# Altium footprint library Apalis Evaluation Board.PcbLib: 166 footprints (part 7 of 11)
Each footprint in its own frame and in the unit in brackets; x right, y up, seen from the top. Pads: shape width x height; smd on the part's side, far side on the other; paste and mask are expansions set on the pad; w line width, h text height; cw(c..) or ccw(c..) is an arc to the next point about the centre after c.
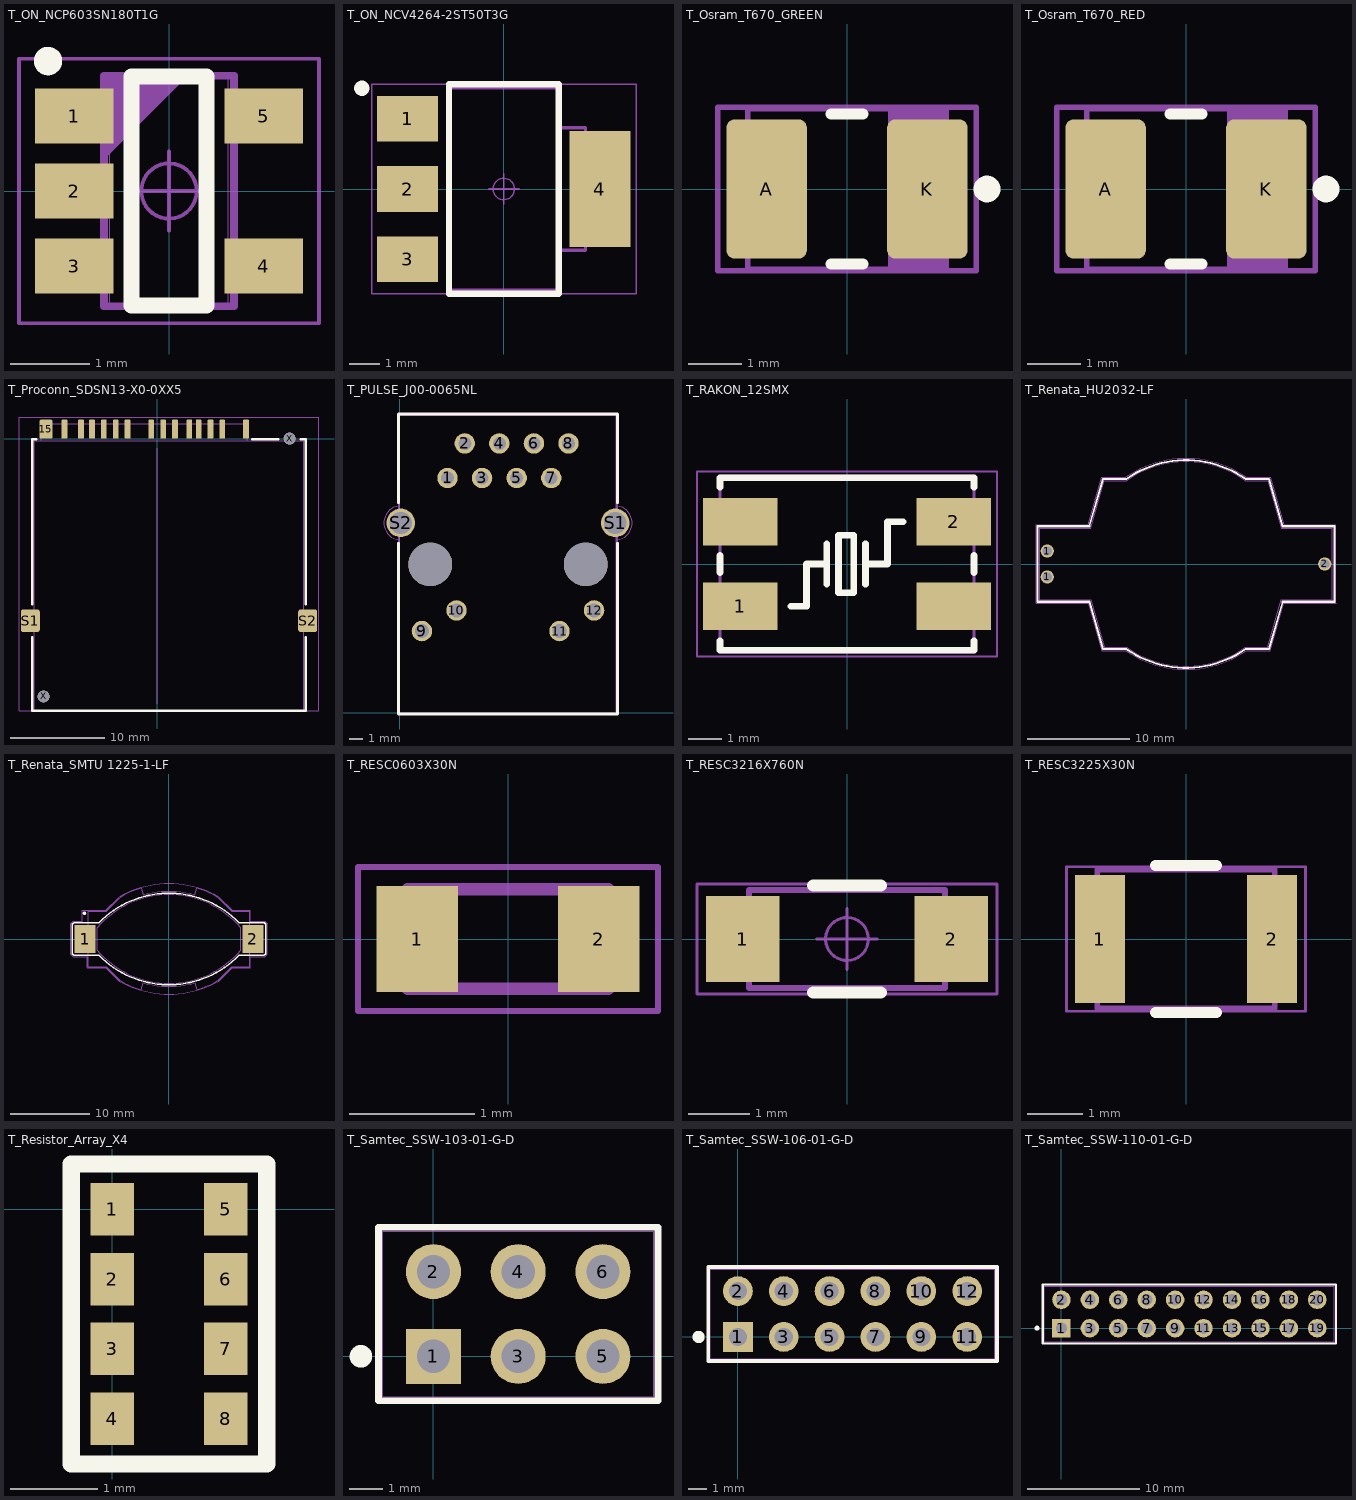
[diagram p6: the footprints below, top view; thin cyan lines are the x and y axes]

## T_ON_NCP603SN180T1G [mm] "SOT 23"
height 1.1
pads (5):
  rect 1x0.7 smd: 1(-1.2,0.95) 2(-1.2,0) 3(-1.2,-0.95) 4(1.2,-0.95) 5(1.2,0.95)
Top Overlay:
  circle w0.2: c-1.533,1.646 r0.08
  lines w0.2: -0.475,-1.45 0.475,-1.45 0.475,1.45 -0.475,1.45 -0.475,-1.45
Mechanical 1:
  circle w0.05: c0,0 r0.35
  lines w0.05: -0.5,0 0.5,0 ; 0,-0.5 0,0.5 ; -1.9,-1.675 1.9,-1.675 1.9,1.675 -1.9,1.675 -1.9,-1.675
Mechanical 2:
  lines w0.001: -0.75,-1.5 0.75,-1.5 0.75,1.5 -0.75,1.5 -0.75,-1.5
Mechanical 3:
  lines w0.1: -0.825,0.46 0.175,1.46 ; -0.825,0.56 0.075,1.46 ; -0.825,0.66 -0.025,1.46 ; -0.825,0.76 -0.125,1.46 ; -0.825,0.86 -0.225,1.46 ; -0.825,0.96 -0.325,1.46 ; -0.825,1.06 -0.425,1.46 ; -0.825,1.16 -0.525,1.46 ; -0.825,1.26 -0.625,1.46 ; -0.825,1.36 -0.725,1.46 ; -0.825,-1.46 0.825,-1.46 0.825,1.46 -0.825,1.46 -0.825,-1.46
3D body: height 1.1, standoff 0, extent -0.75,-1.5 0.75,1.5

## T_ON_NCV4264-2ST50T3G [mm] "SO4"
height 1.8
pads (4):
  rect 2x1.5 smd: 1(-3.15,2.3) 2(-3.15,0) 3(-3.15,-2.3)
  rect 2x3.8 smd: 4(3.15,0)
Top Overlay:
  circle w0.25: c-4.65,3.3 r0.125
  lines w0.2: -1.8,-3.43 -1.8,3.43 1.8,3.43 1.8,-3.43 -1.8,-3.43
Mechanical 1:
  circle w0.05: c0,0 r0.35
  lines w0.05: -0.5,0 0.5,0 ; 0,-0.5 0,0.5 ; -4.33,-3.43 -4.33,3.43 4.33,3.43 4.33,-3.43 -4.33,-3.43
Mechanical 2:
  lines w0.001: -1.85,-3.35 1.85,-3.35 1.85,3.35 -1.85,3.35 -1.85,-3.35
Mechanical 3:
  lines w0.1: 1.79,-2.006 2.68,-2.006 2.68,2.006 1.79,2.006 ; -1.79,-3.302 -1.79,3.302 1.79,3.302 1.79,-3.302 -1.79,-3.302
3D body: height 1.75, standoff 0, extent -1.85,-3.35 1.85,3.35

## T_Osram_T670_GREEN [mm] "LED-Osram-T670"
height 2.1
pads (2):
  rrect20% 1.5x2.6 smd: A(-1.5,0) K(1.5,0)
Top Overlay:
  circle w0.25: c2.613,0 r0.125
  lines w0.2: -0.3,-1.4 0.3,-1.4 ; -0.3,1.4 0.3,1.4
Mechanical 1:
  lines w0.1: -2.413,-1.524 2.413,-1.524 2.413,1.524 -2.413,1.524 -2.413,-1.524
Mechanical 2:
  lines w0.001: -1.85,-1.5 1.85,-1.5 1.85,1.5 -1.85,1.5 -1.85,-1.5
Mechanical 3:
  rectangle: 0.762,-1.5 1.85,1.5
  lines w0.1: -1.85,-1.5 -1.85,1.5 1.85,1.5 1.85,-1.5 -1.85,-1.5
3D body: height 2.1, standoff 0, extent -1.85,-1.5 1.85,1.5

## T_Osram_T670_RED [mm] "LED-Osram-T670"
height 2.1
pads (2):
  rrect20% 1.5x2.6 smd: A(-1.5,0) K(1.5,0)
Top Overlay:
  circle w0.25: c2.613,0 r0.125
  lines w0.2: -0.3,-1.4 0.3,-1.4 ; -0.3,1.4 0.3,1.4
Mechanical 1:
  lines w0.1: -2.413,-1.524 2.413,-1.524 2.413,1.524 -2.413,1.524 -2.413,-1.524
Mechanical 2:
  lines w0.001: -1.85,-1.5 -1.85,1.5 1.85,1.5 1.85,-1.5 -1.85,-1.5
Mechanical 3:
  rectangle: 0.762,-1.5 1.85,1.5
  lines w0.1: -1.85,-1.5 1.85,-1.5 1.85,1.5 -1.85,1.5 -1.85,-1.5
3D body: height 2.1, standoff 0, extent -1.85,-1.5 1.85,1.5

## T_Proconn_SDSN13-X0-0XX5 [mm] "PROCONN_SD,SDIO/MMC,MMC4.0 CARDHOLDER"
height 3.25
pads (19):
  rrect25% 0.6x2 smd: 1(9.38,1) 2(6.88,1) 3(5.63,1) 4(4.38,1) 5(3.4,1) 6(1.88,1) 7(0.63,1) 8(-0.63,1) 9(-3.13,1) 10(-4.38,1) 11(-5.63,1) 12(-6.88,1) 13(-8.05,1) 14(-9.8,1)
  rrect25% 1.4x2 smd: 15(-11.75,1)
  rrect25% 2x2.4 smd: S1(-13.4,-19.25) S2(15.9,-19.25)
  round 1.25 hole 1.25 unplated: X(-12,-27.25) X(14,0)
Top Overlay:
  lines w0.254: -13.2,-21 -13.2,-28.75 15.7,-28.75 15.7,-21 ; -13.2,-17.5 -13.2,-0.05 -12.75,-0.05 ; 10.05,-0.05 12.8,-0.05 ; 15.15,-0.05 15.7,-0.05 15.7,-17.5
Mechanical 1:
  lines w0.05: -14.6,-28.75 17.1,-28.75 17.1,2.25 -14.6,2.25 -14.6,-28.75
Mechanical 2:
  lines w0.01: -13,-20.05 -13.95,-20.05 -13.95,-18.45 -13,-18.45 ; -12.27,-0.25 -12.27,1.55 9.5,1.55 9.5,-0.25 ; 0,-28 0,-1 ; 15.5,-20.05 16.45,-20.05 16.45,-18.45 15.5,-18.45 ; -13,-28.75 15.5,-28.75 15.5,-0.25 -13,-0.25 -13,-28.75
  text "CL CARD" at 2.77,-19 h2
Mechanical 3:
  lines w0.1: -13,-28.75 -13,-0.25 15.5,-0.25 15.5,-28.75 -13,-28.75
3D body: height 0.3, standoff 0, extent -13.95,-20.05 -13,-18.45
3D body: height 0.3, standoff 0, extent 15.5,-20.05 16.45,-18.45
3D body: height 3.25, standoff 0, extent -13,-28.75 15.5,-0.25

## T_PULSE_J00-0065NL [mm] "RJ45 Connector"
height 14.22
pads (16):
  round 1.5 hole 0.95: 1(3.495,17.24) 2(4.765,19.78) 3(6.035,17.24) 4(7.305,19.78) 5(8.575,17.24) 6(9.845,19.78) 7(11.115,17.24) 8(12.385,19.78)
  round 1.5 hole 1.02: 9(1.615,5.99) 10(4.155,7.51) 11(11.725,5.99) 12(14.265,7.51)
  round 2.1 hole 1.63: S1(15.815,13.94) S2(0.065,13.94)
  round 3.2 hole 3.2: ""(2.225,10.89) ""(13.655,10.89)
Top Overlay:
  lines w0.2: -0.102,12.446 -0.102,-0.102 15.983,-0.102 15.983,12.446 ; -0.102,15.418 -0.102,21.942 15.983,21.942 15.983,15.418
Mechanical 1:
  region: 5.81,17.065 5.81,17.415 6.26,17.415 6.26,17.065
  lines w0.05: -0.102,-0.102 -0.102,12.701 cw(c0.064,13.94) -0.101,15.179 -0.102,21.941 15.981,21.941 15.981,15.179 cw(c15.816,13.94) 15.981,12.701 15.981,-0.102 -0.102,-0.102
Mechanical 2:
  lines w0.001: 0,0 15.88,0 15.88,21.84 0,21.84 0,0
Mechanical 3:
  lines w0.1: -0.102,-0.102 15.983,-0.102 15.983,21.941 -0.102,21.941 -0.102,-0.102
3D body: height 13.32, standoff -3.23, extent 0,0 15.88,21.84

## T_RAKON_12SMX [mm] "OSC"
height 1.4
pads (4):
  rect 2.2x1.4 smd: 1(-3.15,-1.25) 2(3.15,1.25) ""(-3.15,1.25) ""(3.15,-1.25)
Top Overlay:
  lines w0.2: -3.75,-2.55 3.75,-2.55 ; -3.75,-2.548 -3.75,-2.269 ; -3.75,-0.25 -3.75,0.25 ; -3.75,2.269 -3.75,2.548 ; -3.75,2.55 3.75,2.55 ; -1.65,-1.25 -1.2,-1.25 ; -0.6,-0.6 -0.6,0.6 ; -0.6,0 -1.2,0 -1.2,-1.25 ; 0.55,-0.6 0.55,0.6 ; 0.55,0 1.2,0 1.2,1.25 1.65,1.25 ; 3.75,-2.548 3.75,-2.269 ; 3.75,-0.25 3.75,0.25 ; 3.75,2.269 3.75,2.548 ; -1.2,-1.25 -1.2,-1.25 ; -0.25,-0.85 0.2,-0.85 0.2,0.85 -0.25,0.85 -0.25,-0.85
Mechanical 1:
  lines w0.05: -4.43,-2.73 -4.43,2.73 4.43,2.73 4.43,-2.73 -4.43,-2.73
Mechanical 2:
  lines w0.001: -3.75,-2.6 -3.75,2.6 3.75,2.6 3.75,-2.6 -3.75,-2.6
Mechanical 3:
  lines w0.1: -3.75,-2.6 -3.75,2.6 3.75,2.6 3.75,-2.6 -3.75,-2.6
3D body: height 1.4, standoff 0, extent -3.75,-2.6 3.75,2.6

## T_Renata_HU2032-LF [mm] "C2032 Battery Holder"
height 5.2
pads (3):
  round 1.3 hole 0.9: 1(-13.6,-1.27) 1(-13.6,1.27) 2(13.6,0)
Top Overlay:
  lines w0.2: -5.86,8.331 -8.133,8.331 -9.483,3.7 -14.55,3.7 -14.55,-3.7 ; -5.845,-8.331 -8.135,-8.331 -9.48,-3.7 -14.55,-3.7 ; -5.843,-8.33 ccw(c0,0) 5.839,-8.334 ; -5.839,8.334 cw(c0,0) 5.843,8.33 ; 5.845,8.331 8.135,8.331 9.48,3.7 14.55,3.7 ; 5.86,-8.331 8.133,-8.331 9.483,-3.7 14.55,-3.7 14.55,3.7 ; -14.55,-3.7 -14.55,-3.7 ; 14.55,3.7 14.55,3.7
Mechanical 1:
  lines w0.05: -14.702,-3.851 -14.702,3.849 -9.599,3.849 ; -14.7,-3.85 -9.599,-3.85 -8.252,-8.489 -5.895,-8.489 ccw(c0,0) 5.895,-8.489 8.252,-8.489 ; -9.599,3.849 -8.252,8.489 ; -8.252,8.489 -5.895,8.489 cw(c0,0) 5.895,8.489 8.252,8.489 9.599,3.85 14.7,3.85 14.7,-3.85 ; 8.252,-8.489 9.599,-3.849 ; 9.599,-3.849 14.702,-3.849
Mechanical 2:
  lines w0.01: -14.35,-3.5 -9.35,-3.5 -8,-8.15 -5.818,-8.15 ccw(c0,0) 5.818,-8.15 8,-8.15 9.35,-3.5 14.35,-3.5 14.35,3.5 9.35,3.5 8,8.15 5.818,8.15 ccw(c0,0) -5.818,8.15 -8,8.15 -9.35,3.5 -14.35,3.5 -14.35,-3.5
Mechanical 3:
  lines w0.1: -14.35,-3.5 -9.35,-3.5 -8,-8.15 -5.818,-8.15 ccw(c0,0) 5.818,-8.15 8,-8.15 9.35,-3.5 14.35,-3.5 14.35,3.5 9.35,3.5 8,8.15 5.818,8.15 ccw(c0,0) -5.818,8.15 -8,8.15 -9.35,3.5 -14.35,3.5 -14.35,-3.5
3D body: height 5.2, standoff 0, extent -14.35,-8.15 14.35,8.15
3D body: height 5.2, standoff 0, extent -10.417,-10.479 10.5,10.479

## T_Renata_SMTU 1225-1-LF [mm] "Battery Holder"
height 4.8
pads (2):
  rect 2.6x3.5 smd: 1(-10.55,0) 2(10.55,0)
Top Overlay:
  circle w0.2: c-10.625,3.25 r0.125
  lines w0.2: -8.8,2.05 -11.95,2.05 -12.15,1.85 -12.15,-1.85 -11.95,-2.05 -8.795,-2.05 ; -8.799,-2.05 ccw(c0,6.55) 8.794,-2.055 ; -8.794,2.055 cw(c0,-6.55) 8.799,2.05 ; 8.797,-2.05 11.95,-2.05 12.15,-1.85 12.15,1.86 11.96,2.05 8.797,2.05
Mechanical 1:
  lines w0.05: -7.924,-3.605 -10.247,-3.605 -10.247,-2.251 -12.024,-2.251 -12.357,-1.918 -12.357,1.926 -12.026,2.257 -10.918,2.257 -10.918,3.585 -7.95,3.585 -6.259,5.275 ; -7.92,-3.607 -6.244,-5.283 ; -6.262,5.274 cw(c0,-5.7) 6.276,5.266 ; -6.238,-5.288 ccw(c0,5.7) 6.239,-5.287 ; 6.244,-5.282 7.933,-3.593 10.237,-3.593 10.237,-2.245 12.04,-2.245 12.345,-1.94 12.345,1.939 12.037,2.247 10.242,2.247 10.242,3.589 7.956,3.589 6.281,5.265 6.281,5.266
Mechanical 2:
  lines w0.01: -6.194,5.206 -7.9,3.5 -10.15,3.5 -10.15,-3.5 -7.9,-3.5 -6.191,-5.209 ; -6.192,5.208 cw(c0.004,-5.568) -3.513,6.355 ; -6.189,-5.21 ccw(c0,5.57) -3.515,-6.353 ; -3.514,-6.353 -3.256,-5.514 ccw(c0.001,6.351) 3.246,-5.517 ; -3.513,6.354 -3.246,5.517 ; -3.245,5.516 cw(c0,-6.352) 3.246,5.516 3.505,6.356 cw(c0,-5.57) 6.189,5.21 ; 3.247,-5.517 3.517,-6.352 ccw(c0,5.57) 6.198,-5.205 7.903,-3.5 7.899,-3.5 10.15,-3.5 10.15,3.5 7.9,3.5 6.192,5.209
Mechanical 3:
  lines w0.1: -9.03,-1.42 -9.03,1.42 ; -9.028,-1.424 ccw(c0,6.357) 9.028,-1.424 ; -9.028,1.424 cw(c0,-6.357) 9.028,1.424 ; 9.026,-1.424 9.026,1.416

## T_RESC0603X30N [mm]
height 0.45
pads (2):
  rect 0.65x0.85 smd: 1(-0.725,0) 2(0.725,0)
Mechanical 1:
  lines w0.05: -1.2,-0.575 -1.2,0.575 1.2,0.575 1.2,-0.575 -1.2,-0.575
Mechanical 2:
  lines w0.001: -0.8,-0.4 -0.8,0.4 0.8,0.4 0.8,-0.4 -0.8,-0.4
Mechanical 3:
  lines w0.1: -0.8,-0.4 -0.8,0.4 0.8,0.4 0.8,-0.4 -0.8,-0.4
3D body: height 0.5, standoff 0, extent -0.8,-0.4 0.8,0.4

## T_RESC3216X760N [mm]
height 0.6
pads (2):
  rect 1.2x1.4 smd: 1(-1.7,0) 2(1.7,0)
Top Overlay:
  lines w0.2: -0.55,-0.875 0.55,-0.875 ; -0.55,0.875 0.55,0.875
Mechanical 1:
  circle w0.05: c0,0 r0.35
  lines w0.05: -0.5,0 0.5,0 ; 0,-0.5 0,0.5 ; -2.45,-0.9 2.45,-0.9 2.45,0.9 -2.45,0.9 -2.45,-0.9
Mechanical 2:
  lines w0.001: -1.6,-0.8 -1.6,0.8 1.6,0.8 1.6,-0.8 -1.6,-0.8
Mechanical 3:
  lines w0.1: -1.6,-0.8 1.6,-0.8 1.6,0.8 -1.6,0.8 -1.6,-0.8
3D body: height 0.6, standoff 0, extent -1.6,-0.8 1.6,0.8

## T_RESC3225X30N [mm]
height 0.7
pads (2):
  rect 0.9x2.3 smd: 1(-1.55,0) 2(1.55,0)
Top Overlay:
  lines w0.2: -0.55,-1.325 0.55,-1.325 ; -0.55,1.325 0.55,1.325
Mechanical 1:
  lines w0.05: -2.15,-1.3 2.15,-1.3 2.15,1.3 -2.15,1.3 -2.15,-1.3
Mechanical 2:
  lines w0.001: -1.6,-1.25 -1.6,1.25 1.6,1.25 1.6,-1.25 -1.6,-1.25
Mechanical 3:
  lines w0.1: -1.6,-1.25 1.6,-1.25 1.6,1.25 -1.6,1.25 -1.6,-1.25
3D body: height 0.7, standoff 0, extent -1.6,-1.25 1.6,1.25

## T_Resistor_Array_X4 [mm] "Resistor Array 0.8mm"
pads (8):
  rect 0.5x0.6 smd: 1(0,0) 2(0,-0.8) 3(0,-1.6) 4(0,-2.4) 5(1.3,0) 6(1.3,-0.8) 7(1.3,-1.6) 8(1.3,-2.4)
Top Overlay:
  lines w0.2: -0.47,-2.92 1.77,-2.92 1.77,0.52 -0.47,0.52 -0.47,-2.92
Mechanical 1:
  lines w0.05: -0.47,-2.92 1.77,-2.92 1.77,0.52 -0.47,0.52 -0.47,-2.92
Mechanical 2:
  lines w0.001: -0.47,-2.92 1.77,-2.92 1.77,0.52 -0.47,0.52 -0.47,-2.92
Mechanical 3:
  lines w0.1: -0.47,-2.92 1.77,-2.92 1.77,0.52 -0.47,0.52 -0.47,-2.92
3D body: height 0.55, standoff 0, extent -0.47,-2.92 1.77,0.52

## T_Samtec_SSW-103-01-G-D [mm] "Receptacle Female Socket  2x3 Pins, 2.54 mm pitch"
height 8.51
pads (6):
  rect 1.65x1.65 hole 1: 1(0,0)
  round 1.65 hole 1: 2(0,2.54) 3(2.54,0) 4(2.54,2.54) 5(5.08,0) 6(5.08,2.54)
Top Overlay:
  circle w0.5: c-2.175,0 r0.088
  lines w0.2: -1.65,-1.33 -1.65,3.87 6.73,3.87 6.73,-1.33 -1.65,-1.33
Mechanical 1:
  lines w0.05: -1.625,-1.305 6.705,-1.305 6.705,3.845 -1.625,3.845 -1.625,-1.305
Mechanical 2:
  lines w0.001: -1.525,-1.205 6.605,-1.205 6.605,3.745 -1.525,3.745 -1.525,-1.205
Mechanical 3:
  lines w0.1: -1.625,-1.305 -1.625,3.845 6.705,3.845 6.705,-1.305 -1.625,-1.305
3D body: height 8.52, standoff -2.63, extent -1.524,-1.206 6.604,3.747

## T_Samtec_SSW-106-01-G-D [mm] "Receptacle Female Socket  2x6 Pins, 2.54 mm pitch"
height 8.51
pads (12):
  rect 1.65x1.65 hole 1: 1(0,0)
  round 1.65 hole 1: 2(0,2.54) 3(2.54,0) 4(2.54,2.54) 5(5.08,0) 6(5.08,2.54) 7(7.62,0) 8(7.62,2.54) 9(10.16,0) 10(10.16,2.54) 11(12.7,0) 12(12.7,2.54)
Top Overlay:
  circle w0.5: c-2.175,0 r0.088
  lines w0.2: -1.65,-1.33 14.35,-1.33 14.35,3.87 -1.65,3.87 -1.65,-1.33
Mechanical 1:
  lines w0.05: -1.625,-1.305 -1.625,3.845 14.325,3.845 14.325,-1.305 -1.625,-1.305
Mechanical 2:
  lines w0.001: -1.525,-1.205 -1.525,3.745 14.225,3.745 14.225,-1.205 -1.525,-1.205
Mechanical 3:
  lines w0.1: -1.625,-1.305 -1.625,3.845 14.325,3.845 14.325,-1.305 -1.625,-1.305
3D body: height 8.52, standoff -2.63, extent -1.524,-1.206 14.224,3.747

## T_Samtec_SSW-110-01-G-D [mm] "Receptacle Female Socket  2x10 Pins, 2.54 mm pitch"
height 8.51
pads (20):
  rect 1.65x1.65 hole 1: 1(0,0)
  round 1.65 hole 1: 2(0,2.54) 3(2.54,0) 4(2.54,2.54) 5(5.08,0) 6(5.08,2.54) 7(7.62,0) 8(7.62,2.54) 9(10.16,0) 10(10.16,2.54) 11(12.7,0) 12(12.7,2.54) 13(15.24,0) 14(15.24,2.54) 15(17.78,0) 16(17.78,2.54) 17(20.32,0) 18(20.32,2.54) 19(22.86,0) 20(22.86,2.54)
Top Overlay:
  circle w0.25: c-2.173,0.002 r0.1
  lines w0.2: -1.675,-1.358 24.535,-1.358 24.535,3.897 -1.675,3.897 -1.675,-1.358
Mechanical 1:
  lines w0.05: -1.675,-1.358 -1.675,3.897 24.535,3.897 24.535,-1.358 -1.675,-1.358
Mechanical 2:
  lines w0.001: -1.524,-1.206 -1.524,3.747 24.384,3.747 24.384,-1.206 -1.524,-1.206
Mechanical 3:
  lines w0.1: -1.524,-1.206 -1.524,3.747 24.384,3.747 24.384,-1.206 -1.524,-1.206
3D body: height 8.52, standoff -2.63, extent -1.524,-1.206 24.384,3.747